# Altium footprint library ZZQ_PCBLib.PcbLib: 84 footprints (part 2 of 6)
Each footprint in its own frame and in the unit in brackets; x right, y up, seen from the top. Pads: shape width x height; smd on the part's side, far side on the other; paste and mask are expansions set on the pad; w line width, h text height; cw(c..) or ccw(c..) is an arc to the next point about the centre after c.
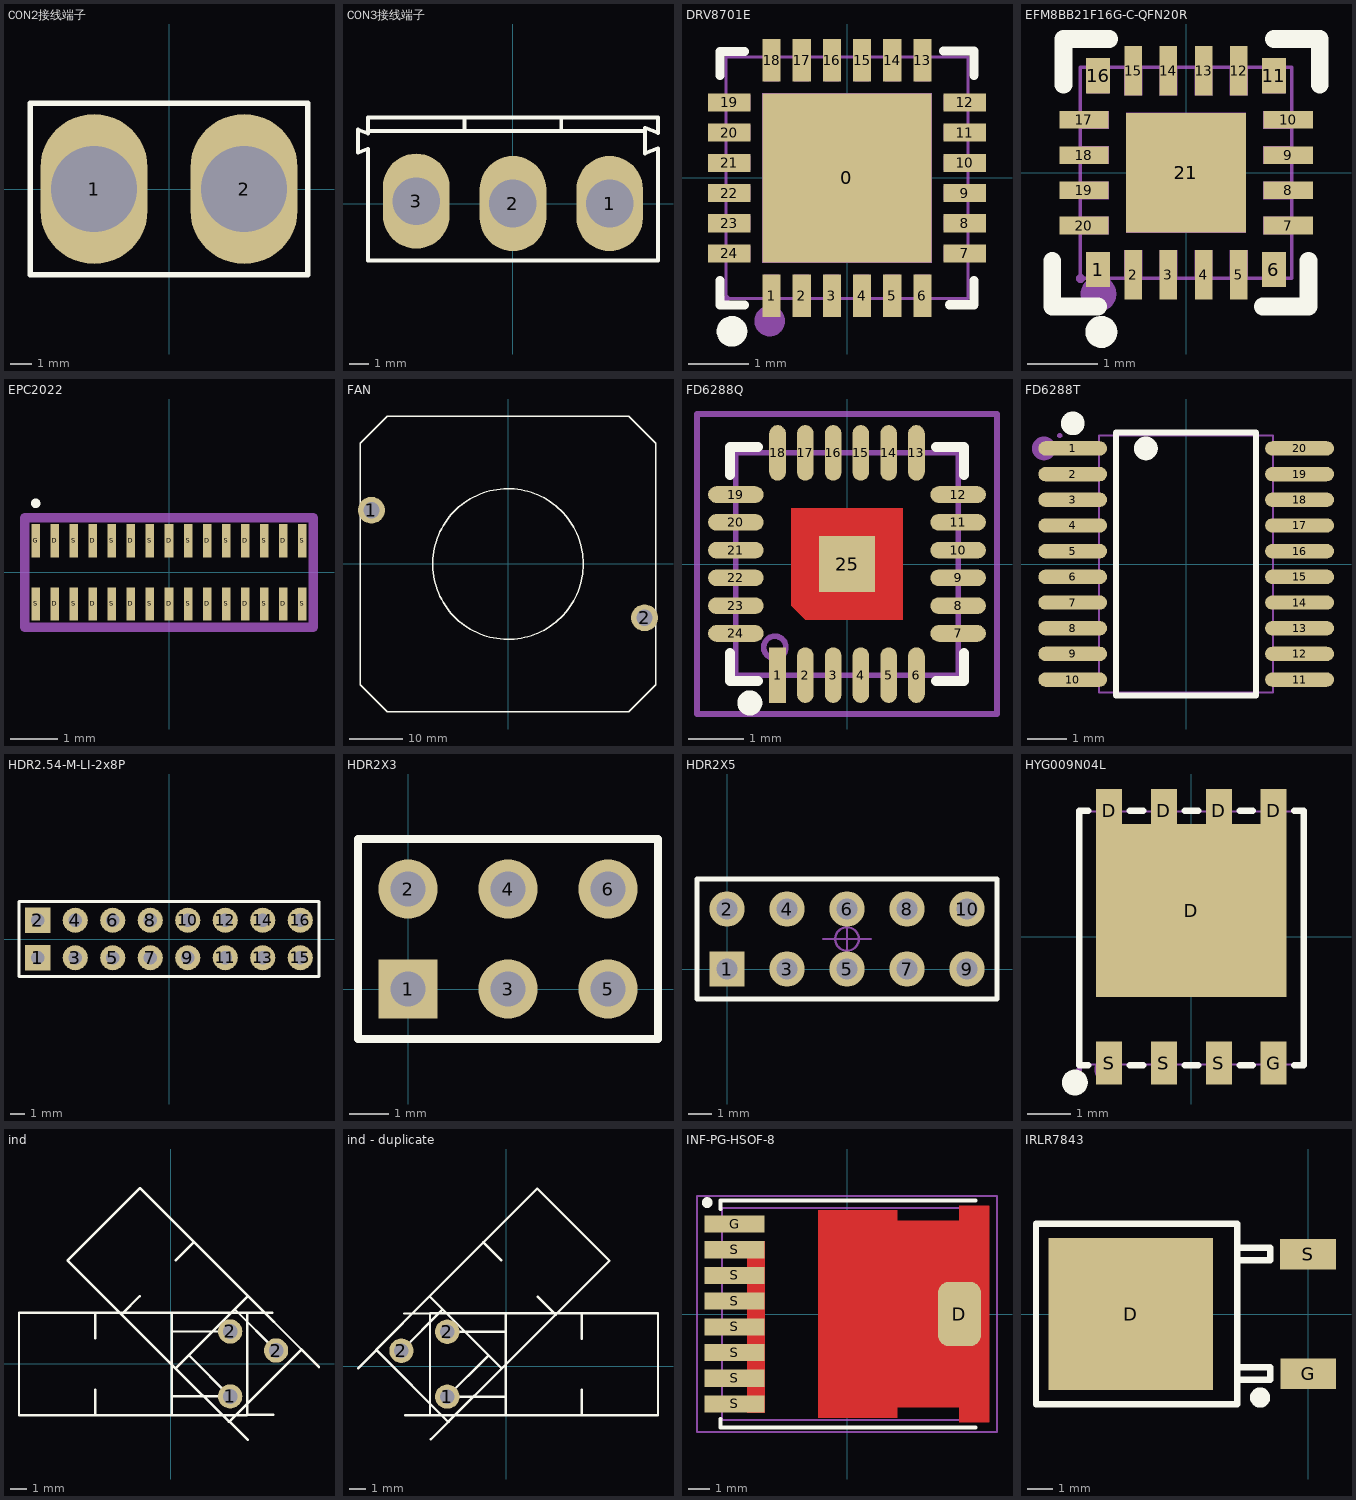
[diagram p1: the footprints below, top view; thin cyan lines are the x and y axes]

## CON2接线端子 [mm]
pads (2):
  oval 5x7 hole 4: 1(-3.5,0) 2(3.5,0)
Top Overlay:
  lines w0.254: -6.477,-4 -6.477,4 6.477,4 6.477,-4 -6.477,-4

## CON3接线端子 [mm]
pads (3):
  oval 3.5x5 hole 2.5: 1(5.08,0) 2(0,0) 3(-5.08,0.127)
Top Overlay:
  lines w0.2: -7.62,2.879 -8.14,2.676 -8.14,3.886 -7.62,3.683 -7.62,4.525 ; 7.62,-2.997 7.62,2.904 6.934,2.636 6.934,3.976 7.62,3.708 7.62,4.525
  lines w0.203: -7.62,2.879 -7.62,-2.997 7.62,-2.997 ; -7.62,3.81 6.905,3.81 ; -7.62,4.525 7.62,4.525 ; -2.54,3.81 -2.54,4.445 ; 2.54,3.81 2.54,4.445
3D body "User Library-TER-KF128-3P.step": height 14.35, standoff -4.95, extent -7.966,-4.572 7.874,5.928

## DRV8701E [mm]
pads (25):
  rect 2.8x2.8 smd paste-100 mask+0.051: 0(0,0)
  rect 0.3x0.7 smd paste-100 mask+0.051: 1(-1.25,-1.95) 2(-0.75,-1.95) 3(-0.25,-1.95) 4(0.25,-1.95) 5(0.75,-1.95) 6(1.25,-1.95) 13(1.25,1.95) 14(0.75,1.95) 15(0.25,1.95) 16(-0.25,1.95) 17(-0.75,1.95) 18(-1.25,1.95)
  rect 0.7x0.3 smd paste-100 mask+0.051: 7(1.95,-1.25) 8(1.95,-0.75) 9(1.95,-0.25) 10(1.95,0.25) 11(1.95,0.75) 12(1.95,1.25) 19(-1.95,1.25) 20(-1.95,0.75) 21(-1.95,0.25) 22(-1.95,-0.25) 23(-1.95,-0.75) 24(-1.95,-1.25)
Top Overlay:
  circle w0.254: c-1.905,-2.54 r0.127
  lines w0.15: -2.1,-1.7 -2.1,-2.104 -1.7,-2.104 ; -2.1,1.696 -2.1,2.096 -1.7,2.096 ; 1.6,2.1 2.1,2.1 2.1,1.7 ; 1.7,-2.1 2.1,-2.1 2.1,-1.7
Top Paste:
  region: -0.9,-1.6 -0.9,-2.3 -0.6,-2.3 -0.6,-1.6
  region: 0.4,-2.3 0.4,-1.6 0.1,-1.6 0.1,-2.3
  region: -1.1,-2.3 -1.1,-1.6 -1.4,-1.6 -1.4,-2.3
  region: 0.9,-2.3 0.9,-1.6 0.6,-1.6 0.6,-2.3
  region: -0.4,-1.6 -0.4,-2.3 -0.1,-2.3 -0.1,-1.6
  region: 1.4,-2.3 1.4,-1.6 1.1,-1.6 1.1,-2.3
  region: 1.6,-1.1 1.6,-1.4 2.3,-1.4 2.3,-1.1
  region: -2.3,-1.1 -2.3,-1.4 -1.6,-1.4 -1.6,-1.1
  region: 1.6,-0.6 1.6,-0.9 2.3,-0.9 2.3,-0.6
  region: -2.3,-0.6 -2.3,-0.9 -1.6,-0.9 -1.6,-0.6
  region: 1.6,-0.1 1.6,-0.4 2.3,-0.4 2.3,-0.1
  region: -2.3,-0.1 -2.3,-0.4 -1.6,-0.4 -1.6,-0.1
  region: 1.6,0.4 1.6,0.1 2.3,0.1 2.3,0.4
  region: -2.3,0.4 -2.3,0.1 -1.6,0.1 -1.6,0.4
  region: 1.6,0.9 1.6,0.6 2.3,0.6 2.3,0.9
  region: -2.3,0.9 -2.3,0.6 -1.6,0.6 -1.6,0.9
  region: -1.1,1.1 -1.1,-1.1 1.1,-1.1 1.1,1.1
  region: 2.3,1.1 2.3,1.4 1.6,1.4 1.6,1.1
  region: -2.3,1.4 -2.3,1.1 -1.6,1.1 -1.6,1.4
  region: -0.9,2.3 -0.9,1.6 -0.6,1.6 -0.6,2.3
  region: -0.1,1.6 -0.1,2.3 -0.4,2.3 -0.4,1.6
  region: 0.4,1.6 0.4,2.3 0.1,2.3 0.1,1.6
  region: 0.9,1.6 0.9,2.3 0.6,2.3 0.6,1.6
  region: -1.4,2.3 -1.4,1.6 -1.1,1.6 -1.1,2.3
  region: 1.4,1.6 1.4,2.3 1.1,2.3 1.1,1.6
Mechanical 6:
  circle w0.254: c-1.28,-2.37 r0.127
Mechanical 15:
  region: -2,-1.37 -2,-1.13 -1.6,-1.13 -1.6,-1.37
  region: -2,-0.87 -2,-0.63 -1.6,-0.63 -1.6,-0.87
  region: -2,-0.37 -2,-0.13 -1.6,-0.13 -1.6,-0.37
  region: -2,0.13 -2,0.37 -1.6,0.37 -1.6,0.13
  region: -2,0.63 -2,0.87 -1.6,0.87 -1.6,0.63
  region: -2,1.13 -2,1.37 -1.6,1.37 -1.6,1.13
  region: -1.37,1.6 -1.37,2 -1.13,2 -1.13,1.6
  region: -0.87,1.6 -0.87,2 -0.63,2 -0.63,1.6
  region: -0.37,1.6 -0.37,2 -0.13,2 -0.13,1.6
  region: 0.13,1.6 0.13,2 0.37,2 0.37,1.6
  region: 0.63,1.6 0.63,2 0.87,2 0.87,1.6
  region: 1.13,1.6 1.13,2 1.37,2 1.37,1.6
  region: 1.6,1.13 1.6,1.37 2,1.37 2,1.13
  region: 1.6,0.63 1.6,0.87 2,0.87 2,0.63
  region: 1.6,0.13 1.6,0.37 2,0.37 2,0.13
  region: 1.6,-0.37 1.6,-0.13 2,-0.13 2,-0.37
  region: 1.6,-0.87 1.6,-0.63 2,-0.63 2,-0.87
  region: 1.6,-1.37 1.6,-1.13 2,-1.13 2,-1.37
  region: 1.13,-2 1.13,-1.6 1.37,-1.6 1.37,-2
  region: 0.63,-2 0.63,-1.6 0.87,-1.6 0.87,-2
  region: 0.13,-2 0.13,-1.6 0.37,-1.6 0.37,-2
  region: -0.37,-2 -0.37,-1.6 -0.13,-1.6 -0.13,-2
  region: -0.87,-2 -0.87,-1.6 -0.63,-1.6 -0.63,-2
  region: -1.37,-2 -1.37,-1.6 -1.13,-1.6 -1.13,-2
  region: -1.399,-1.401 -1.399,1.399 1.401,1.399 1.401,-1.401
  region: -1.94,-2 -1.94,-1.975 -1.975,-1.94 -2.025,-1.94 -2.06,-1.975 -2.06,-2 -2.06,-2.025 -2.025,-2.06 -1.975,-2.06 -1.94,-2.025
  lines w0.051: -2,-2 -2,2 2,2 2,-2 -2,-2
3D body "DRV8701ERGER.stp": height 1, standoff 0, extent -2.05,-2.05 2.05,2.05

## EFM8BB21F16G-C-QFN20R [mm]
pads (21):
  rect 0.34x0.5 smd paste+0 mask+0.05: 1(-1.252,-1.377) 6(1.249,-1.377) 11(1.249,1.377) 16(-1.252,1.377)
  rect 0.25x0.7 smd paste+0 mask+0.05: 2(-0.751,-1.45) 3(-0.252,-1.45) 4(0.249,-1.45) 5(0.748,-1.45) 12(0.748,1.45) 13(0.249,1.45) 14(-0.252,1.45) 15(-0.751,1.45)
  rect 0.7x0.25 smd paste+0 mask+0.05: 7(1.451,-0.75) 8(1.451,-0.25) 9(1.451,0.25) 10(1.451,0.75) 17(-1.451,0.75) 18(-1.451,0.25) 19(-1.451,-0.25) 20(-1.451,-0.75)
  rect 1.7x1.7 smd paste+0 mask+0.05: 21(-0.001,0)
Top Overlay:
  circle w0.254: c-1.204,-2.262 r0.1
  lines w0.254: -1.901,-1.251 -1.901,-1.9 -1.252,-1.9 ; -1.742,1.251 -1.742,1.9 -1.092,1.9 ; 1.089,-1.9 1.739,-1.9 1.739,-1.251 ; 1.249,1.9 1.899,1.9 1.899,1.251
Mechanical 6:
  circle w0.254: c-1.245,-1.721 r0.127
Mechanical 15:
  region: -0.876,-1.1 -0.626,-1.1 -0.626,-1.5 -0.876,-1.5
  region: -0.377,-1.1 -0.127,-1.1 -0.127,-1.5 -0.377,-1.5
  region: 0.124,-1.1 0.374,-1.1 0.374,-1.5 0.124,-1.5
  region: 0.623,-1.1 0.873,-1.1 0.873,-1.5 0.623,-1.5
  region: 1.098,-0.625 1.498,-0.625 1.498,-0.875 1.098,-0.875
  region: 1.098,-0.125 1.498,-0.125 1.498,-0.375 1.098,-0.375
  region: 1.098,0.375 1.498,0.375 1.498,0.125 1.098,0.125
  region: 1.098,0.875 1.498,0.875 1.498,0.625 1.098,0.625
  region: 0.623,1.5 0.873,1.5 0.873,1.1 0.623,1.1
  region: 0.124,1.5 0.374,1.5 0.374,1.1 0.124,1.1
  region: -0.377,1.5 -0.127,1.5 -0.127,1.1 -0.377,1.1
  region: -0.876,1.5 -0.626,1.5 -0.626,1.1 -0.876,1.1
  region: -1.502,0.875 -1.102,0.875 -1.102,0.625 -1.502,0.625
  region: -1.502,0.375 -1.102,0.375 -1.102,0.125 -1.502,0.125
  region: -1.502,-0.125 -1.102,-0.125 -1.102,-0.375 -1.502,-0.375
  region: -1.502,-0.625 -1.102,-0.625 -1.102,-0.875 -1.502,-0.875
  region: 1.089,-1.129 1.409,-1.129 1.409,-1.449 1.089,-1.449
  region: 1.089,1.449 1.409,1.449 1.409,1.129 1.089,1.129
  region: -1.412,-1.129 -1.092,-1.129 -1.092,-1.449 -1.412,-1.449
  region: -1.412,1.449 -1.092,1.449 -1.092,1.129 -1.412,1.129
  region: -0.852,0.85 0.848,0.85 0.848,-0.85 -0.852,-0.85
  region: -1.442,-1.5 -1.442,-1.475 -1.477,-1.44 -1.526,-1.44 -1.562,-1.475 -1.562,-1.5 -1.562,-1.525 -1.526,-1.56 -1.477,-1.56 -1.442,-1.525
  lines w0.051: -1.502,-1.5 -1.502,1.5 1.498,1.5 1.498,-1.5 -1.502,-1.5

## EPC2022 [mm]
pads (30):
  rect 0.18x0.7 smd: D(-2.4,-0.665) D(-2.4,0.665) D(-1.6,-0.665) D(-1.6,0.665) D(-0.8,-0.665) D(-0.8,0.665) D(0,-0.665) D(0,0.665) D(0.8,-0.665) D(0.8,0.665) D(1.6,-0.665) D(1.6,0.665) D(2.4,-0.665) D(2.4,0.665) G(-2.8,0.665) S(-2.8,-0.665) S(-2,-0.665) S(-2,0.665) S(-1.2,-0.665) S(-1.2,0.665) S(-0.4,-0.665) S(-0.4,0.665) S(0.4,-0.665) S(0.4,0.665) S(1.2,-0.665) S(1.2,0.665) S(2,-0.665) S(2,0.665) S(2.8,-0.665) S(2.8,0.665)
Top Overlay:
  lines w0.1: -2.8,1.4 ccw(c-2.8,1.45) -2.8,1.5 ccw(c-2.8,1.45) -2.8,1.4
Mechanical 13:
  lines w0.2: -3.025,-1.15 3.025,-1.15 3.025,1.15 -3.025,1.15 -3.025,-1.15
Mechanical 15:
  lines w0.1: -3.025,-1.143 3.048,-1.143 3.048,1.15 -3.025,1.15 -3.025,-1.143
3D body "EPC2022.stp": height 0.88, standoff 0, extent -3.025,-1.15 3.025,1.15

## FAN [mm]
height 1.8
pads (2):
  round 5 hole 3: 1(-25.4,10) 2(25.4,-10)
Top Overlay:
  circle w0.254: c0,0 r14
  lines w0.254: -27.5,-22.5 -27.5,22.5 -22.5,27.5 22.5,27.5 27.5,22.5 27.5,-22.5 22.5,-27.5 -22.5,-27.5 -27.5,-22.5
3D body: height 17.1, standoff 7.1, extent -20.5,-20.494 20.5,20.494
3D body: height 17, standoff 5, extent -27.5,-27.5 27.5,27.5
3D body: height 17.1, standoff -5, extent -26.894,8.503 -23.906,11.497
3D body: height 17.1, standoff -5, extent 23.906,-11.497 26.894,-8.503

## FD6288Q [mm] "24脚，长x宽x高：4x4x1mm，脚距：0.5mm"
pads (25):
  rect 0.3x1 smd: 1(-1.25,-2)
  oval 0.3x1 smd: 2(-0.75,-2) 3(-0.25,-2) 4(0.25,-2) 5(0.75,-2) 6(1.25,-2) 13(1.25,2) 14(0.75,2) 15(0.25,2) 16(-0.25,2) 17(-0.75,2) 18(-1.25,2)
  oval 1x0.3 smd: 7(2,-1.25) 8(2,-0.75) 9(2,-0.25) 10(2,0.25) 11(2,0.75) 12(2,1.25) 19(-2,1.25) 20(-2,0.75) 21(-2,0.25) 22(-2,-0.25) 23(-2,-0.75) 24(-2,-1.25)
  rect 1x1 smd: 25(0,0)
Top Layer:
  region: -1,1 1,1 1,-1 -0.75,-1 -1,-0.75
Top Overlay:
  circle w0.25: c-1.75,-2.5 r0.1
  lines w0.178: -2.106,-1.6 -2.106,-2.106 -1.6,-2.106 ; -2.106,1.6 -2.106,2.106 -1.6,2.106 ; 1.6,-2.106 2.106,-2.106 2.106,-1.6 ; 1.6,2.106 2.106,2.106 2.106,1.6
Mechanical 13:
  circle w0.1: c-1.3,-1.5 r0.2
  lines w0.1: -2,-2 -2,2 2,2 2,-2 -2,-2
Mechanical 15:
  circle w0.05: c0,0 r0.35
  lines w0.05: -0.5,0 0.5,0 ; 0,-0.5 0,0.5
  lines w0.1: -2.7,-2.7 2.7,-2.7 2.7,2.7 -2.7,2.7 -2.7,-2.7
3D body "QFN24-4x4.STEP": height 0.95, standoff -0.05, extent -2.01,-2.01 2.01,2.01

## FD6288T [mm]
pads (20):
  oval 1.742x0.364 smd: 1(-2.871,2.925) 2(-2.871,2.275) 3(-2.871,1.625) 4(-2.871,0.975) 5(-2.871,0.325) 6(-2.871,-0.325) 7(-2.871,-0.975) 8(-2.871,-1.625) 9(-2.871,-2.275) 10(-2.871,-2.925) 11(2.871,-2.925) 12(2.871,-2.275) 13(2.871,-1.625) 14(2.871,-0.975) 15(2.871,-0.325) 16(2.871,0.325) 17(2.871,0.975) 18(2.871,1.625) 19(2.871,2.275) 20(2.871,2.925)
Top Overlay:
  circle w0.3: c-2.871,3.559 r0.15
  circle w0.3: c-1.019,2.925 r0.15
  lines w0.152: -1.771,-3.326 -1.771,3.326 1.771,3.326 1.771,-3.326 -1.771,-3.326
Mechanical 6:
  circle w0.3: c-3.6,2.925 r0.15
Mechanical 15:
  drawing of 45 lines, arcs and shapes, not listed
3D body "TSSOP20.STEP": height 1.03, standoff -0.02, extent -3.202,-3.25 3.202,3.25

## HDR2.54-M-LI-2x8P [mm]
pads (16):
  rect 1.7x1.7 hole 0.9: 1(-8.89,-1.27) 2(-8.89,1.27)
  round 1.7 hole 0.9: 3(-6.35,-1.27) 4(-6.35,1.27) 5(-3.81,-1.27) 6(-3.81,1.27) 7(-1.27,-1.27) 8(-1.27,1.27) 9(1.27,-1.27) 10(1.27,1.27) 11(3.81,-1.27) 12(3.81,1.27) 13(6.35,-1.27) 14(6.35,1.27) 15(8.89,-1.27) 16(8.89,1.27)
Top Overlay:
  lines w0.2: -10.16,-2.54 -10.16,0 -10.16,2.54 10.16,2.54 10.16,0 10.16,-2.54 -10.16,-2.54
3D body "HDR2.54-1P_M.STEP": height 8.5, standoff -3, extent -7.62,-2.54 -5.08,0
3D body "HDR2.54-1P_M.STEP": height 8.5, standoff -3, extent -10.16,-2.54 -7.62,0
3D body "HDR2.54-1P_M.STEP": height 8.5, standoff -3, extent -2.54,-2.54 0,0
3D body "HDR2.54-1P_M.STEP": height 8.5, standoff -3, extent -5.08,-2.54 -2.54,0
3D body "HDR2.54-1P_M.STEP": height 8.5, standoff -3, extent 2.54,-2.54 5.08,0
3D body "HDR2.54-1P_M.STEP": height 8.5, standoff -3, extent 0,-2.54 2.54,0
3D body "HDR2.54-1P_M.STEP": height 8.5, standoff -3, extent 7.62,-2.54 10.16,0
3D body "HDR2.54-1P_M.STEP": height 8.5, standoff -3, extent 5.08,-2.54 7.62,0
3D body "HDR2.54-1P_M.STEP": height 8.5, standoff -3, extent -7.62,0 -5.08,2.54
3D body "HDR2.54-1P_M.STEP": height 8.5, standoff -3, extent -10.16,0 -7.62,2.54
3D body "HDR2.54-1P_M.STEP": height 8.5, standoff -3, extent -2.54,0 0,2.54
3D body "HDR2.54-1P_M.STEP": height 8.5, standoff -3, extent -5.08,0 -2.54,2.54
3D body "HDR2.54-1P_M.STEP": height 8.5, standoff -3, extent 2.54,0 5.08,2.54
3D body "HDR2.54-1P_M.STEP": height 8.5, standoff -3, extent 0,0 2.54,2.54
3D body "HDR2.54-1P_M.STEP": height 8.5, standoff -3, extent 7.62,0 10.16,2.54
3D body "HDR2.54-1P_M.STEP": height 8.5, standoff -3, extent 5.08,0 7.62,2.54

## HDR2X3 [mm]
pads (6):
  rect 1.5x1.5 hole 0.9: 1(0,0)
  round 1.5 hole 0.9: 2(0,2.54) 3(2.54,0) 4(2.54,2.54) 5(5.08,0) 6(5.08,2.54)
Top Overlay:
  lines w0.2: 1.482,-1.27 6.35,-1.27 ; 6.35,-1.27 6.35,3.81 -1.27,3.81 -1.27,-1.27 6.35,-1.27
3D body "HDR2x3.STEP": height 8.54, standoff -3, extent -1.27,-1.27 6.35,3.81

## HDR2X5 [mm] "Connector; Header; 5x2 Position"
pads (10):
  rect 1.5x1.5 hole 0.9: 1(0,0)
  round 1.5 hole 0.9: 2(0,2.54) 3(2.54,0) 4(2.54,2.54) 5(5.08,0) 6(5.08,2.54) 7(7.62,0) 8(7.62,2.54) 9(10.16,0) 10(10.16,2.54)
Top Overlay:
  lines w0.2: -1.27,-1.27 11.43,-1.27 11.43,3.81 -1.27,3.81 -1.27,-1.27
Top Designator:
  text ".Designator" at 5.306,-0.982 h1
Top Component Outline:
  lines w0.1: -1.27,-1.27 11.43,-1.27 11.43,3.81 -1.27,3.81 -1.27,-1.27
Top Component Center:
  circle w0.1: c5.08,1.27 r0.5
  lines w0.1: 4.08,1.27 6.08,1.27 ; 5.08,0.27 5.08,2.27
3D body "HDR2x5.STEP": height 8.54, standoff -3, extent -1.27,-1.27 11.43,3.81

## HYG009N04L [mm]
pads (9):
  rect 0.6x1 smd mask+0.05: D(-1.905,2.925) D(-0.635,2.925) D(0.635,2.925) D(1.905,2.925) G(1.905,-2.925) S(-1.905,-2.925) S(-0.635,-2.925) S(0.635,-2.925)
  rect 4.41x4 smd mask+0.05: D(0,0.61)
Top Overlay:
  circle w0.3: c-2.7,-3.375 r0.15
  lines w0.152: -2.385,-2.975 -2.6,-2.975 -2.6,2.925 -2.385,2.925 ; -1.425,-2.975 -1.115,-2.975 ; -1.425,2.925 -1.115,2.925 ; -0.155,-2.975 0.155,-2.975 ; -0.155,2.925 0.155,2.925 ; 1.115,-2.975 1.425,-2.975 ; 1.115,2.925 1.425,2.925 ; 2.385,-2.975 2.6,-2.975 2.6,2.925 2.385,2.925
Top Paste:
  region: -2.205,-3.425 -1.605,-3.425 -1.605,-2.425 -2.205,-2.425
  region: -0.935,-3.425 -0.335,-3.425 -0.335,-2.425 -0.935,-2.425
  region: 0.335,-3.425 0.935,-3.425 0.935,-2.425 0.335,-2.425
  region: 1.605,-3.425 2.205,-3.425 2.205,-2.425 1.605,-2.425
  region: 2.205,3.425 1.605,3.425 1.605,2.61 0.935,2.61 0.935,3.425 0.335,3.425 0.335,2.61 -0.335,2.61 -0.335,3.425 -0.935,3.425 -0.935,2.61 -1.605,2.61 -1.605,3.425 -2.205,3.425 -2.205,-1.39 2.205,-1.39
Mechanical 6:
  circle w0.3: c-1.95,-3.075 r0.15
Mechanical 15:
  region: -2.125,-1.27 -2.125,2.55 2.125,2.55 2.125,-1.27
  region: -2.105,-2.475 -1.705,-2.475 -1.705,-3.075 -2.105,-3.075
  region: -0.835,-2.475 -0.435,-2.475 -0.435,-3.075 -0.835,-3.075
  region: 0.435,-2.475 0.835,-2.475 0.835,-3.075 0.435,-3.075
  region: 1.705,-2.475 2.105,-2.475 2.105,-3.075 1.705,-3.075
  region: 1.705,3.075 2.105,3.075 2.105,2.475 1.705,2.475
  region: 0.435,3.075 0.835,3.075 0.835,2.475 0.435,2.475
  region: -0.835,3.075 -0.435,3.075 -0.435,2.475 -0.835,2.475
  region: -2.105,3.075 -1.705,3.075 -1.705,2.475 -2.105,2.475
  region: -2.54,-3.075 -2.54,-3.05 -2.575,-3.015 -2.625,-3.015 -2.66,-3.05 -2.66,-3.075 -2.66,-3.1 -2.625,-3.135 -2.575,-3.135 -2.54,-3.1
  lines w0.051: -2.6,-2.955 2.6,-2.955 2.6,2.905 -2.6,2.905 -2.6,-2.955
3D body "TPH1R403NL,L1Q.stp": height 1.1, standoff 0, extent -2.5,-3.417 2.5,3.363

## ind [mm] "前瞻电感"
height 1.1
pads (3):
  round 1.5 hole 0.9: 1(3.65,-2.015) 2(3.65,1.985) 2(6.478,0.814)
Top Overlay:
  lines w0.15: 0.099,1.985 3.65,1.985 ; 0.111,-2.015 3.65,-2.015 1.147,0.487 ; 3.967,3.324 6.478,0.814 ; 4.715,3.109 4.689,3.135 0.05,3.135 ; 4.715,3.135 4.715,-3.14 4.69,-3.165 0.05,-3.165 ; 8.026,0.855 8.026,0.892 4.746,4.172 ; 8.044,0.873 3.607,-3.564 3.572,-3.564 0.291,-0.282 ; 0.05,-3.165 -9.35,-3.165 -9.35,3.135 0.05,3.135 ; 0.05,-3.165 0.05,3.135 ; 0.291,-0.282 -6.356,6.364 -1.901,10.819 4.746,4.172 ; 0.291,-0.282 4.746,4.172
  lines w0.152: -4.65,-3.165 -4.65,-1.59 ; -4.65,1.56 -4.65,3.135 ; -3.033,3.041 -1.919,4.155 ; 0.308,6.382 1.422,7.496 ; 3.607,-3.564 4.739,-4.695 ; 4.715,-3.14 6.315,-3.14 ; 4.715,3.135 6.239,3.135 ; 8.044,0.873 9.122,-0.204

## ind - duplicate [mm] "前瞻电感"
height 1.1
pads (3):
  round 1.5 hole 0.9: 1(-3.65,-1.858) 2(-6.478,0.97) 2(-3.65,2.142)
Top Overlay:
  lines w0.15: -6.478,0.97 -3.976,3.472 ; -4.715,-3.008 -4.715,3.267 -4.69,3.292 -0.05,3.292 ; -4.715,-2.982 -4.689,-3.008 -0.05,-3.008 ; -3.65,2.142 -0.111,2.142 ; -3.608,-3.406 -3.571,-3.406 -0.291,-0.126 ; -3.59,-3.425 -8.027,1.012 -8.027,1.048 -4.746,4.329 ; -1.139,0.653 -3.65,-1.858 -0.099,-1.858 ; -4.746,4.329 1.901,10.976 6.356,6.521 -0.291,-0.126 ; -4.746,4.329 -0.291,-0.126 ; -0.05,-3.008 9.35,-3.008 9.35,3.292 -0.05,3.292 ; -0.05,-3.008 -0.05,3.292
  lines w0.152: -9.158,-0.119 -8.027,1.012 ; -6.315,3.267 -4.715,3.267 ; -6.239,-3.008 -4.715,-3.008 ; -4.667,-4.502 -3.59,-3.425 ; -1.422,7.652 -0.308,6.539 ; 1.919,4.311 3.033,3.198 ; 4.65,-3.008 4.65,-1.433 ; 4.65,1.717 4.65,3.292

## INF-PG-HSOF-8 [mm] "PG-HSOF-8-1"
height 2.4
pads (9):
  rrect50% 2x3 smd paste+0 mask+0: D(5.25,0)
  rect 2.8x0.8 smd paste+0 mask+0: G(-5.25,4.2) S(-5.25,-4.2) S(-5.25,-3) S(-5.25,-1.8) S(-5.25,-0.6) S(-5.25,0.6) S(-5.25,1.8) S(-5.25,3)
Top Layer:
  region: 6.65,5.05 6.65,-5.05 5.25,-5.05 5.25,-4.35 2.35,-4.35 2.35,-4.85 -1.35,-4.85 -1.35,4.85 2.35,4.85 2.35,4.35 5.25,4.35 5.25,5.05
  region: -3.85,3.4 -3.85,-4.6 -4.65,-4.6 -4.65,3.4
Top Overlay:
  circle w0.25: c-6.525,5.2 r0.125
  lines w0.2: -5.9,-4.9 -5.9,-5.3 6,-5.3 ; -5.9,4.9 -5.9,5.3 6,5.3
Mechanical 3:
  text ".DESIGNATOR" at 0,0 h1.2
Mechanical 13:
  lines w0.1: -5.84,-4.95 -5.84,4.95 5.84,4.95 5.84,-4.95 -5.84,-4.95
Mechanical 15:
  lines w0.1: -0.5,0 0.5,0 ; 0,-0.5 0,0.5 ; -7,-5.5 -7,5.5 7,5.5 7,-5.5 -7,-5.5
3D body: height 2.4, standoff 2.4, extent -4.77,3.916 -4.171,4.514
3D body: height 0.5, standoff 0, extent -0.85,-4.9 5.9,4.9
3D body: height 0.5, standoff 0, extent -5.8,3.8 -3.861,4.6
3D body: height 0.5, standoff 0, extent -5.8,-4.6 -3.861,3.4
3D body "PG-HSOF-8-1.stp": height 2.31, standoff 0, extent -5.837,-4.95 5.838,4.95

## IRLR7843 [mm]
pads (3):
  rect 6.5x6 smd: D(-7,0)
  rect 2.2x1.2 smd: G(0,-2.361) S(-0.004,2.361)
Top Overlay:
  circle w0.4: c-1.9,-3.3 r0.2
  lines w0.254: -2.804,2.123 -1.504,2.123 -1.504,2.623 -2.804,2.623 ; -2.8,-2.6 -1.5,-2.6 -1.5,-2.1 -2.8,-2.1 ; -10.75,-3.573 -10.75,3.573 -2.8,3.573 -2.8,-3.573 -10.75,-3.573
3D body "TO-252.STEP": height 2.44, standoff 0.03, extent -9.738,-3.27 0.2,3.27